# Altium footprint library BeaconBoard.PcbLib: 39 footprints (part 2 of 3)
Each footprint in its own frame and in the unit in brackets; x right, y up, seen from the top. Pads: shape width x height; smd on the part's side, far side on the other; paste and mask are expansions set on the pad; w line width, h text height; cw(c..) or ccw(c..) is an arc to the next point about the centre after c.
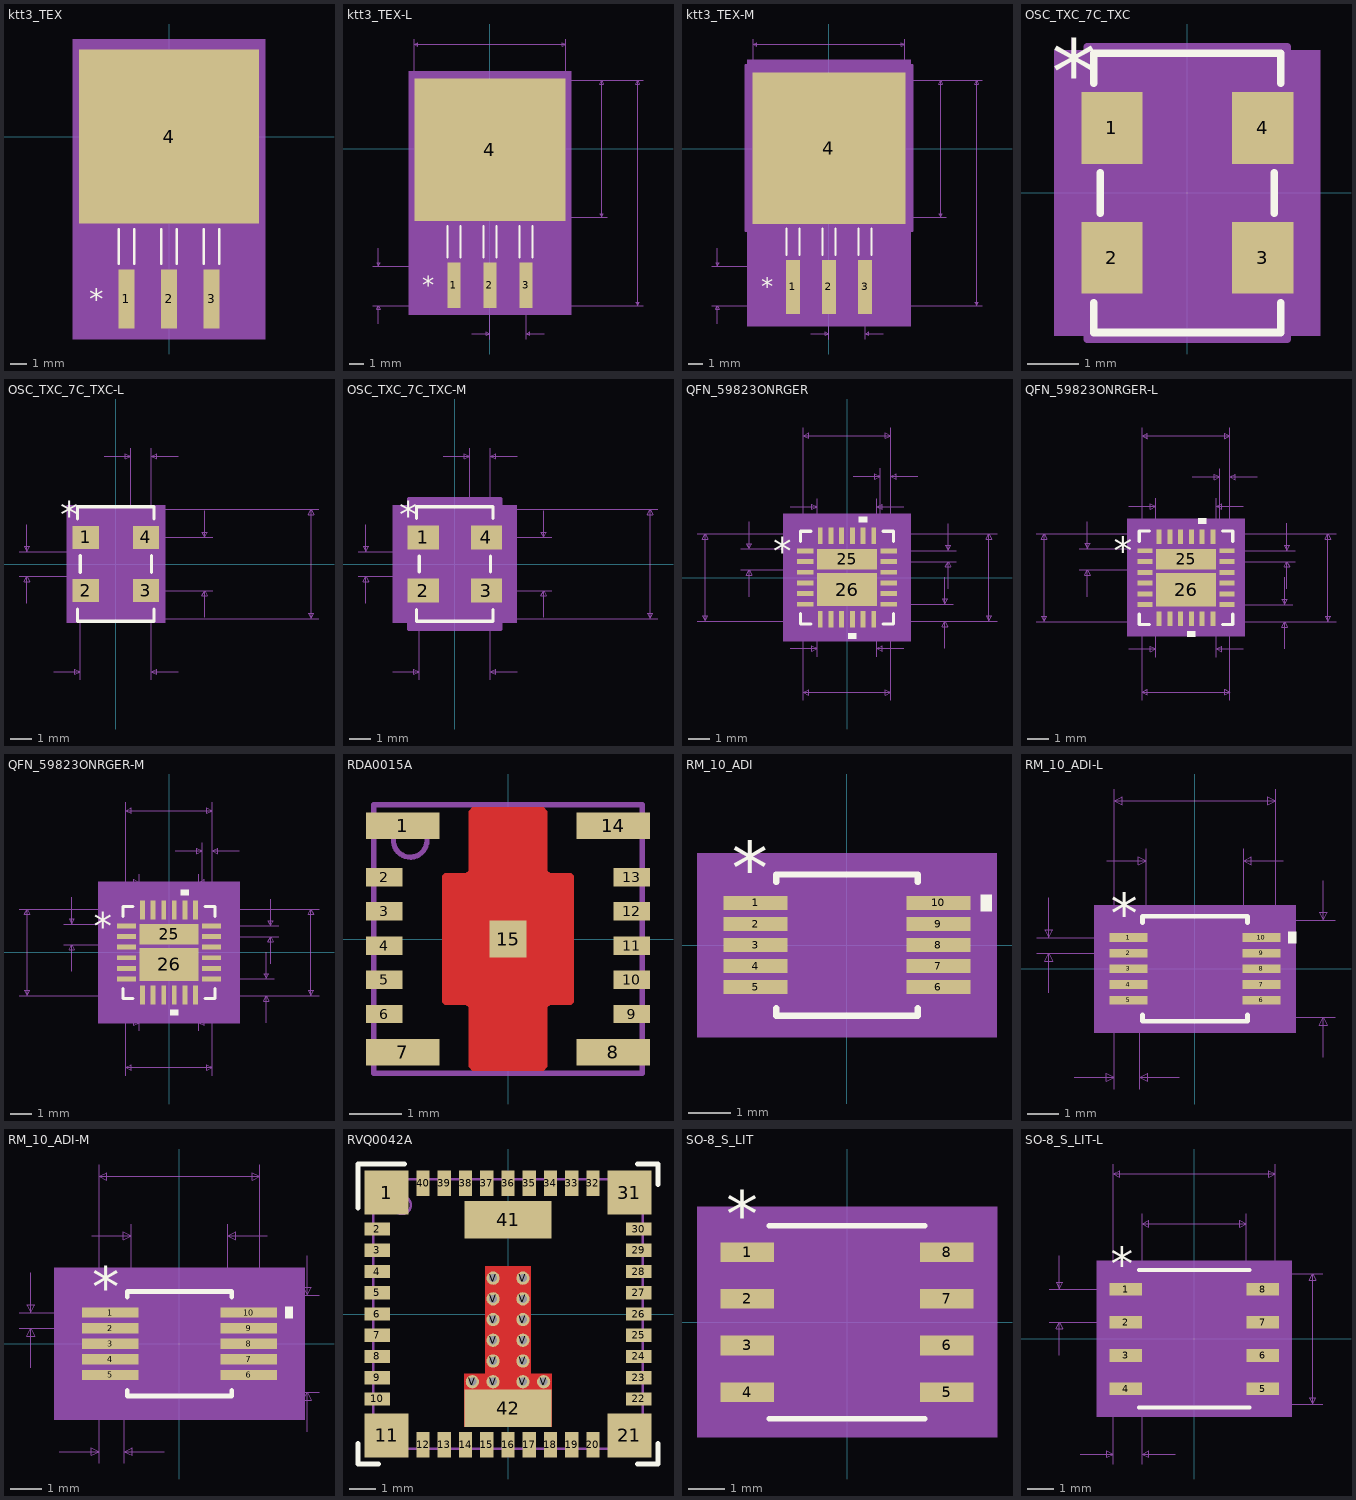
[diagram p1: the footprints below, top view; thin cyan lines are the x and y axes]

## ktt3_TEX [mil]
pads (4):
  rect 38x138 smd paste+0 mask+0: 1(-100,-381) 2(0,-381) 3(100,-381)
  rect 422x408 smd paste+0 mask+0: 4(0,0)
Top Overlay:
  lines w6: -118,-298 -118,-217.1 ; -82,-298 -82,-217.1 ; -18,-298 -18,-217.1 ; 18,-298 18,-217.1 ; 82,-298 82,-217.1 ; 118,-298 118,-217.1
  text "*" at -187.5,-406 h50
Mechanical 5:
  region: -226,229 226,229 226,-475 -226,-475
Mechanical 13:
  lines w1: -210,-190 -210,190 210,190 210,-190 -210,-190 ; -118,-436 -82,-436 -82,-190 -118,-190 -118,-436 ; -18,-436 18,-436 18,-190 -18,-190 -18,-436 ; 82,-436 118,-436 118,-190 82,-190 82,-436
  text "*" at -112.5,-205 h50
Mechanical 15:
  region: -129,-214 -221,-214 -221,214 221,214 221,-214 129,-214 129,-460 -129,-460
  lines w6: -221,-214 -129,-214 -129,-460 129,-460 129,-214 221,-214 221,214 -221,214 -221,-214
3D body: height 10, standoff 0, extent 0,0 10,10
3D body "ktt3_TEX.step": height 67.09, standoff -2.01, extent -210,-292.98 210,190.13

## ktt3_TEX-L [mil]
pads (4):
  rect 36x126 smd paste+0 mask+0: 1(-100,-379) 2(0,-379) 3(100,-379)
  rect 420x396 smd paste+0 mask+0: 4(0,-2)
Top Overlay:
  lines w6: -118,-302 -118,-214 ; -82,-302 -82,-214 ; -18,-302 -18,-214 ; 18,-302 18,-214 ; 82,-302 82,-214 ; 118,-302 118,-214
  text "*" at -187.5,-404 h50
Mechanical 5:
  region: -225,215 225,215 225,-461 -225,-461
Mechanical 7:
  lines w1: -325,-436 0,-436 425,-436 ; -325,-326 0,-326 ; -310,-486 -310,-436 ; -310,-276 -310,-326 ; -210,0 -210,305 ; -50,-513 0,-513 ; 0,-528 0,-313 ; 0,-190 325,-190 ; 100,-528 100,-313 ; 150,-513 100,-513 ; 210,0 210,305 ; 325,190 0,190 425,190 ; -310,-436 -305,-446 -315,-446 -310,-436 ; -310,-326 -305,-316 -315,-316 -310,-326 ; -210,290 -200,285 -200,295 -210,290 ; -210,290 210,290 ; 0,-513 -10,-518 -10,-508 0,-513 ; 100,-513 110,-518 110,-508 100,-513 ; 210,290 200,285 200,295 210,290 ; 310,-190 315,-180 305,-180 310,-190 ; 310,-190 310,190 ; 310,190 315,180 305,180 310,190 ; 410,-436 415,-426 405,-426 410,-436 ; 410,-436 410,190 ; 410,190 415,180 405,180 410,190
  text "0.1in/2.54mm" at -25,-558 h25
  text "0.11in/2.794mm" at -505,-393.5 h25
  text "0.626in/15.9mm" at 430,-201.5 h25
  text "0.42in/10.668mm" at -93.75,310 h25
  text "0.38in/9.652mm" at 330,-12.5 h25
  text "Alt 2 Padstyle: OX90Y60D30P" at -337.5,-1011 h50
  text "Alt 1 Padstyle: OX60Y90D30P" at -337.5,-936 h50
  text "Large Padstyle: RX420Y396D0T" at -350,-861 h50
  text "Default Padstyle: RX36Y126D0T" at -362.5,-786 h50
Mechanical 13:
  lines w1: -210,-190 -210,190 210,190 210,-190 -210,-190 ; -118,-436 -82,-436 -82,-190 -118,-190 -118,-436 ; -18,-436 18,-436 18,-190 -18,-190 -18,-436 ; 82,-436 118,-436 118,-190 82,-190 82,-436
  text "*" at -112.5,-205 h50
Mechanical 15:
  region: -122,-204 -214,-204 -214,200 214,200 214,-204 122,-204 122,-446 -122,-446
  lines w6: -214,-204 -122,-204 -122,-446 122,-446 122,-204 214,-204 214,200 -214,200 -214,-204
3D body: height 10, standoff 0, extent 0,0 10,10
3D body "ktt3_TEX.step": height 67.09, standoff -2.01, extent -210,-292.98 210,190.13

## ktt3_TEX-M [mil]
pads (4):
  rect 38x150 smd paste+0 mask+0: 1(-100,-383) 2(0,-383) 3(100,-383)
  rect 424x420 smd paste+0 mask+0: 4(0,2)
Top Overlay:
  lines w6: -118,-294 -118,-221.1 ; -82,-294 -82,-221.1 ; -18,-294 -18,-221.1 ; 18,-294 18,-221.1 ; 82,-294 82,-221.1 ; 118,-294 118,-221.1
  text "*" at -187.5,-408 h50
Mechanical 5:
  region: -227,247 227,247 227,-493 -227,-493
Mechanical 7:
  lines w1: -325,-436 0,-436 425,-436 ; -325,-326 0,-326 ; -310,-486 -310,-436 ; -310,-276 -310,-326 ; -210,0 -210,305 ; -50,-513 0,-513 ; 0,-528 0,-313 ; 0,-190 325,-190 ; 100,-528 100,-313 ; 150,-513 100,-513 ; 210,0 210,305 ; 325,190 0,190 425,190 ; -310,-436 -305,-446 -315,-446 -310,-436 ; -310,-326 -305,-316 -315,-316 -310,-326 ; -210,290 -200,285 -200,295 -210,290 ; -210,290 210,290 ; 0,-513 -10,-518 -10,-508 0,-513 ; 100,-513 110,-518 110,-508 100,-513 ; 210,290 200,285 200,295 210,290 ; 310,-190 315,-180 305,-180 310,-190 ; 310,-190 310,190 ; 310,190 315,180 305,180 310,190 ; 410,-436 415,-426 405,-426 410,-436 ; 410,-436 410,190 ; 410,190 415,180 405,180 410,190
  text "0.1in/2.54mm" at -25,-558 h25
  text "0.11in/2.794mm" at -505,-393.5 h25
  text "0.626in/15.9mm" at 430,-205.5 h25
  text "0.42in/10.668mm" at -93.75,310 h25
  text "0.38in/9.652mm" at 330,-12.5 h25
  text "Alt 2 Padstyle: OX90Y60D30P" at -337.5,-1011 h50
  text "Alt 1 Padstyle: OX60Y90D30P" at -337.5,-936 h50
  text "Large Padstyle: RX424Y420D0T" at -350,-861 h50
  text "Default Padstyle: RX38Y150D0T" at -362.5,-786 h50
Mechanical 13:
  lines w1: -210,-190 -210,190 210,190 210,-190 -210,-190 ; -118,-436 -82,-436 -82,-190 -118,-190 -118,-436 ; -18,-436 18,-436 18,-190 -18,-190 -18,-436 ; 82,-436 118,-436 118,-190 82,-190 82,-436
  text "*" at -112.5,-205 h50
Mechanical 15:
  region: -139,-228 -232,-228 -232,232 232,232 232,-228 139,-228 139,-478 -139,-478
  lines w6: -232,-228 -139,-228 -139,-478 139,-478 139,-228 232,-228 232,232 -232,232 -232,-228
3D body "ktt3_TEX.step": height 67.09, standoff -2.01, extent -209.99,-292.99 210.01,190.12
3D body: height 10, standoff 0, extent 0,0 10,10

## OSC_TXC_7C_TXC [mm]
pads (4):
  rect 1.2x1.4 smd paste+0 mask+0: 1(-1.473,1.27) 2(-1.473,-1.27) 3(1.473,-1.27) 4(1.473,1.27)
Top Overlay:
  lines w0.152: -1.829,-2.149 -1.829,-2.73 1.829,-2.73 1.829,-2.149 ; -1.829,2.149 -1.829,2.73 1.829,2.73 1.829,2.149 ; -1.702,-0.391 -1.702,0.391 ; 1.702,-0.391 1.702,0.391
  text "*" at -2.654,1.74 h1.27
Mechanical 5:
  region: 2.603,-2.794 -2.603,-2.794 -2.603,2.794 2.603,2.794
Mechanical 13:
  lines w0: -1.702,-1.765 ccw(c-1.702,-1.27) -1.702,-0.775 ; -1.702,0.775 ccw(c-1.702,1.27) -1.702,1.765 ; 1.702,-1.765 cw(c1.702,-1.27) 1.702,-0.775 ; 1.702,0.775 cw(c1.702,1.27) 1.702,1.765
  lines w0.025: -1.702,-1.765 -1.702,-2.603 1.702,-2.603 1.702,-1.765 ; -1.702,-0.775 -1.702,0.775 ; -1.702,1.765 -1.702,2.603 1.702,2.603 1.702,1.765 ; -1.702,2.349 -1.448,2.603 ; 1.702,-0.775 1.702,0.775
  text "*" at -1.384,1.105 h1.27
Mechanical 15:
  region: -1.956,-2.07 -2.413,-2.07 -2.413,2.07 -1.956,2.07 -1.956,2.857 1.956,2.857 1.956,2.07 2.413,2.07 2.413,-2.07 1.956,-2.07 1.956,-2.857 -1.956,-2.857
  lines w0.152: -2.413,-2.07 -2.413,2.07 -1.956,2.07 -1.956,2.857 1.956,2.857 1.956,2.07 2.413,2.07 2.413,-2.07 1.956,-2.07 1.956,-2.857 -1.956,-2.857 -1.956,-2.07 -2.413,-2.07
3D body: height 0.25, standoff 0, extent 0,0 0.254,0.254

## OSC_TXC_7C_TXC-L [mil]
pads (4):
  rect 49x43 smd paste+0 mask+0: 1(-56.5,50) 2(-56.5,-50) 3(56.5,-50) 4(56.5,50)
Top Overlay:
  lines w6: -72,-84.6 -72,-107.5 72,-107.5 72,-84.6 ; -72,84.6 -72,107.5 72,107.5 72,84.6 ; -67,-15.4 -67,15.4 ; 67,-15.4 67,15.4
  text "*" at -104.5,68.5 h50
Mechanical 5:
  region: 92.5,-110 -92.5,-110 -92.5,110 92.5,110
Mechanical 7:
  lines w1: -182,-23.5 -67,-23.5 ; -182,23.5 -67,23.5 ; -167,-73.5 -167,-23.5 ; -167,73.5 -167,23.5 ; -117,-202.5 -67,-202.5 ; -67,-217.5 -67,25 ; -22,202.5 28,202.5 ; 28,25 28,217.5 ; 67,-217.5 67,25 67,217.5 ; 67,-102.5 382,-102.5 ; 67,-50 182,-50 ; 67,50 182,50 ; 67,102.5 382,102.5 ; 117,-202.5 67,-202.5 ; 117,202.5 67,202.5 ; 167,-100 167,-50 ; 167,100 167,50 ; -167,-23.5 -162,-33.5 -172,-33.5 -167,-23.5 ; -167,23.5 -162,33.5 -172,33.5 -167,23.5 ; -67,-202.5 -77,-207.5 -77,-197.5 -67,-202.5 ; 28,202.5 18,197.5 18,207.5 28,202.5 ; 67,-202.5 77,-207.5 77,-197.5 67,-202.5 ; 67,202.5 77,197.5 77,207.5 67,202.5 ; 167,-50 172,-60 162,-60 167,-50 ; 167,50 172,60 162,60 167,50 ; 367,-102.5 372,-92.5 362,-92.5 367,-102.5 ; 367,-102.5 367,102.5 ; 367,102.5 372,92.5 362,92.5 367,102.5
  text "0.047in/1.194mm" at -374.5,-12.5 h25
  text "0.205in/5.207mm" at 387,-12.5 h25
  text "0.1in/2.54mm" at 187,-12.5 h25
  text "0.039in/0.991mm" at -46.25,222.5 h25
  text "0.134in/3.404mm" at -93.75,-247.5 h25
  text "Alt 2 Padstyle: OX90Y60D30P" at -337.5,-472.5 h50
  text "Alt 1 Padstyle: OX60Y90D30P" at -337.5,-412.5 h50
  text "Default Padstyle: RX49Y43D0T" at -350,-352.5 h50
Mechanical 13:
  lines w0: -67,-69.5 ccw(c-67,-50) -67,-30.5 ; -67,30.5 ccw(c-67,50) -67,69.5 ; 67,-69.5 cw(c67,-50) 67,-30.5 ; 67,30.5 cw(c67,50) 67,69.5
  lines w1: -67,-69.5 -67,-102.5 67,-102.5 67,-69.5 ; -67,-30.5 -67,30.5 ; -67,69.5 -67,102.5 67,102.5 67,69.5 ; -67,92.5 -57,102.5 ; 67,-30.5 67,30.5
  text "*" at -54.5,43.5 h50
Mechanical 15:
  region: -71,-75.5 -85,-75.5 -85,75.5 -71,75.5 -71,106.5 71,106.5 71,75.5 85,75.5 85,-75.5 71,-75.5 71,-106.5 -71,-106.5
  lines w6: -85,-75.5 -71,-75.5 -71,-106.5 71,-106.5 71,-75.5 85,-75.5 85,75.5 71,75.5 71,106.5 -71,106.5 -71,75.5 -85,75.5 -85,-75.5
3D body: height 10, standoff 0, extent 0,0 10,10

## OSC_TXC_7C_TXC-M [mil]
pads (4):
  rect 59x45 smd paste+0 mask+0: 1(-59.5,50) 2(-59.5,-50) 3(59.5,-50) 4(59.5,50)
Top Overlay:
  lines w6: -72,-85.6 -72,-107.5 72,-107.5 72,-85.6 ; -72,85.6 -72,107.5 72,107.5 72,85.6 ; -67,-14.4 -67,14.4 ; 67,-14.4 67,14.4
  text "*" at -104.5,68.5 h50
Mechanical 5:
  region: 116.5,-110 -116.5,-110 -116.5,110 116.5,110
Mechanical 7:
  lines w1: -182,-23.5 -67,-23.5 ; -182,23.5 -67,23.5 ; -167,-73.5 -167,-23.5 ; -167,73.5 -167,23.5 ; -117,-202.5 -67,-202.5 ; -67,-217.5 -67,25 ; -22,202.5 28,202.5 ; 28,25 28,217.5 ; 67,-217.5 67,25 67,217.5 ; 67,-102.5 382,-102.5 ; 67,-50 182,-50 ; 67,50 182,50 ; 67,102.5 382,102.5 ; 117,-202.5 67,-202.5 ; 117,202.5 67,202.5 ; 167,-100 167,-50 ; 167,100 167,50 ; -167,-23.5 -172,-33.5 -162,-33.5 -167,-23.5 ; -167,23.5 -172,33.5 -162,33.5 -167,23.5 ; -67,-202.5 -77,-197.5 -77,-207.5 -67,-202.5 ; 28,202.5 18,207.5 18,197.5 28,202.5 ; 67,-202.5 77,-197.5 77,-207.5 67,-202.5 ; 67,202.5 77,207.5 77,197.5 67,202.5 ; 167,-50 162,-60 172,-60 167,-50 ; 167,50 162,60 172,60 167,50 ; 367,-102.5 367,102.5 ; 367,-102.5 362,-92.5 372,-92.5 367,-102.5 ; 367,102.5 362,92.5 372,92.5 367,102.5
  text "Default Padstyle: RX59Y45D0T" at -350,-352.5 h50
  text "Alt 1 Padstyle: OX60Y90D30P" at -337.5,-412.5 h50
  text "Alt 2 Padstyle: OX90Y60D30P" at -337.5,-472.5 h50
  text "0.134in/3.404mm" at -93.75,-247.5 h25
  text "0.039in/0.991mm" at -46.25,222.5 h25
  text "0.1in/2.54mm" at 187,-12.5 h25
  text "0.205in/5.207mm" at 387,-12.5 h25
  text "0.047in/1.194mm" at -374.5,-12.5 h25
Mechanical 13:
  lines w0: -67,-69.5 ccw(c-67,-50) -67,-30.5 ; -67,30.5 ccw(c-67,50) -67,69.5 ; 67,-69.5 cw(c67,-50) 67,-30.5 ; 67,30.5 cw(c67,50) 67,69.5
  lines w1: -67,-69.5 -67,-102.5 67,-102.5 67,-69.5 ; -67,-30.5 -67,30.5 ; -67,69.5 -67,102.5 67,102.5 67,69.5 ; -67,92.5 -57,102.5 ; 67,-30.5 67,30.5
  text "*" at -54.5,43.5 h50
Mechanical 15:
  region: -87,-92.5 -109,-92.5 -109,92.5 -87,92.5 -87,122.5 87,122.5 87,92.5 109,92.5 109,-92.5 87,-92.5 87,-122.5 -87,-122.5
  lines w6: -109,-92.5 -109,92.5 -87,92.5 -87,122.5 87,122.5 87,92.5 109,92.5 109,-92.5 87,-92.5 87,-122.5 -87,-122.5 -87,-92.5 -109,-92.5
3D body: height 10, standoff 0, extent 0,0 10,10

## QFN_59823ONRGER [mm]
pads (26):
  rect 0.783x0.229 smd paste+0 mask+0: 1(-1.953,1.25) 2(-1.953,0.75) 3(-1.953,0.25) 4(-1.953,-0.25) 5(-1.953,-0.75) 6(-1.953,-1.25) 13(1.953,-1.25) 14(1.953,-0.75) 15(1.953,-0.25) 16(1.953,0.25) 17(1.953,0.75) 18(1.953,1.25)
  rect 0.229x0.783 smd paste+0 mask+0: 7(-1.25,-1.953) 8(-0.75,-1.953) 9(-0.25,-1.953) 10(0.25,-1.953) 11(0.75,-1.953) 12(1.25,-1.953) 19(1.25,1.953) 20(0.75,1.953) 21(0.25,1.953) 22(-0.25,1.953) 23(-0.75,1.953) 24(-1.25,1.953)
  rect 2.794x0.965 smd paste+0 mask+0: 25(0,0.856)
  rect 2.794x1.549 smd paste+0 mask+0: 26(0,-0.564)
Top Overlay:
  region: 0.941,2.599 0.56,2.599 0.56,2.853 0.941,2.853
  region: 0.44,-2.599 0.059,-2.599 0.059,-2.853 0.44,-2.853
  lines w0.152: -2.172,-1.697 -2.172,-2.172 -1.697,-2.172 ; -2.172,1.697 -2.172,2.172 -1.697,2.172 ; 1.697,-2.172 2.172,-2.172 2.172,-1.697 ; 1.697,2.172 2.172,2.172 2.172,1.697
  text "*" at -3.45,0.615 h1.27
Mechanical 5:
  region: 2.98,-2.98 -2.98,-2.98 -2.98,2.98 2.98,2.98
Mechanical 7:
  lines w0.025: -7.021,-2.045 2.045,-2.045 ; -7.021,2.045 2.045,2.045 2.045,-5.751 ; -4.966,0.374 -1.397,0.374 -1.397,-3.696 ; -4.966,1.339 -1.397,1.339 -1.397,3.696 ; -4.585,-0.896 -4.585,0.374 ; -4.585,2.609 -4.585,1.339 ; -2.667,-3.315 -1.397,-3.315 ; -2.667,3.315 -1.397,3.315 ; -2.045,-5.751 -2.045,2.045 ; -2.045,1.25 -2.045,7.021 ; 0.292,4.735 1.562,4.735 ; 1.25,2.045 7.021,2.045 ; 1.397,-3.696 1.397,0.374 ; 1.397,1.339 1.397,3.696 ; 1.562,1.25 1.562,5.116 ; 1.953,0.75 5.116,0.75 ; 1.953,1.25 5.116,1.25 ; 2.045,-1.25 4.966,-1.25 ; 2.045,5.116 2.045,1.25 2.045,7.021 ; 2.667,-3.315 1.397,-3.315 ; 2.667,3.315 1.397,3.315 ; 3.315,4.735 2.045,4.735 ; 4.585,-3.315 4.585,-2.045 ; 4.585,0.02 4.585,-1.25 ; 4.735,-0.52 4.735,0.75 ; 4.735,2.52 4.735,1.25 ; 4.966,-2.045 1.25,-2.045 7.021,-2.045 ; -6.64,-2.045 -6.513,-1.791 -6.767,-1.791 -6.64,-2.045 ; -6.64,-2.045 -6.64,2.045 ; -6.64,2.045 -6.513,1.791 -6.767,1.791 -6.64,2.045 ; -4.585,0.374 -4.458,0.12 -4.712,0.12 -4.585,0.374 ; -4.585,1.339 -4.458,1.593 -4.712,1.593 -4.585,1.339 ; -2.045,-5.37 -1.791,-5.497 -1.791,-5.243 -2.045,-5.37 ; -2.045,-5.37 2.045,-5.37 ; -2.045,6.64 -1.791,6.513 -1.791,6.767 -2.045,6.64 ; -2.045,6.64 2.045,6.64 ; -1.397,-3.315 -1.651,-3.442 -1.651,-3.188 -1.397,-3.315 ; -1.397,3.315 -1.651,3.188 -1.651,3.442 -1.397,3.315 ; 1.397,-3.315 1.651,-3.442 1.651,-3.188 1.397,-3.315 ; 1.397,3.315 1.651,3.188 1.651,3.442 1.397,3.315 ; 1.562,4.735 1.308,4.608 1.308,4.862 1.562,4.735 ; 2.045,-5.37 1.791,-5.497 1.791,-5.243 2.045,-5.37 ; 2.045,4.735 2.299,4.608 2.299,4.862 2.045,4.735 ; 2.045,6.64 1.791,6.513 1.791,6.767 2.045,6.64 ; 4.585,-2.045 4.712,-2.299 4.458,-2.299 4.585,-2.045 ; 4.585,-1.25 4.712,-0.996 4.458,-0.996 4.585,-1.25 ; 4.735,0.75 4.862,0.496 4.608,0.496 4.735,0.75 ; 4.735,1.25 4.862,1.504 4.608,1.504 4.735,1.25 ; 6.64,-2.045 6.767,-1.791 6.513,-1.791 6.64,-2.045 ; 6.64,-2.045 6.64,2.045 ; 6.64,2.045 6.767,1.791 6.513,1.791 6.64,2.045
  text "0.031in/0.795mm" at 2.203,-1.903 h0.64
  text "-0.11in/-2.794mm" at -2.54,3.823 h0.64
  text "0.038in/0.965mm" at -6.966,-0.508 h0.64
  text "0.11in/2.794mm" at -2.222,-4.458 h0.64
  text "0.161in/4.089mm" at -2.381,-6.513 h0.64
  text "0.161in/4.089mm" at -11.91,-0.318 h0.64
  text "0.161in/4.089mm" at 7.148,-0.318 h0.64
  text "0.161in/4.089mm" at -2.381,7.148 h0.64
  text "0.019in/0.483mm" at -0.578,5.243 h0.64
  text "0.02in/0.5mm" at 2.83,0.683 h0.64
  text "Alt 2 Padstyle: b229_152h76" at -8.572,-20.737 h1.27
  text "Alt 1 Padstyle: b152_229h76" at -8.572,-19.213 h1.27
  text "Heat Tab 2 Padstyle: r279_155" at -9.207,-11.593 h1.27
  text "Heat Tab 1 Padstyle: r279_97" at -8.89,-10.069 h1.27
  text "Default Padstyle: r23_78" at -7.62,-8.545 h1.27
Mechanical 13:
  lines w0.025: -2.045,0.775 -0.775,2.045 ; -2.045,-2.045 -2.045,2.045 2.045,2.045 2.045,-2.045 -2.045,-2.045 ; -2.045,-1.39 -2.045,-1.11 -2.045,-1.39 ; -2.045,-0.89 -2.045,-0.61 -2.045,-0.89 ; -2.045,-0.39 -2.045,-0.11 -2.045,-0.39 ; -2.045,0.11 -2.045,0.39 -2.045,0.11 ; -2.045,0.61 -2.045,0.89 -2.045,0.61 ; -2.045,1.11 -2.045,1.39 -2.045,1.11 ; -1.39,-2.045 -1.11,-2.045 -1.39,-2.045 ; -1.39,2.045 -1.11,2.045 -1.39,2.045 ; -0.89,-2.045 -0.61,-2.045 -0.89,-2.045 ; -0.89,2.045 -0.61,2.045 -0.89,2.045 ; -0.39,-2.045 -0.11,-2.045 -0.39,-2.045 ; -0.39,2.045 -0.11,2.045 -0.39,2.045 ; 0.11,-2.045 0.39,-2.045 0.11,-2.045 ; 0.11,2.045 0.39,2.045 0.11,2.045 ; 0.61,-2.045 0.89,-2.045 0.61,-2.045 ; 0.61,2.045 0.89,2.045 0.61,2.045 ; 1.11,-2.045 1.39,-2.045 1.11,-2.045 ; 1.11,2.045 1.39,2.045 1.11,2.045 ; 2.045,-1.39 2.045,-1.11 2.045,-1.39 ; 2.045,-0.89 2.045,-0.61 2.045,-0.89 ; 2.045,-0.39 2.045,-0.11 2.045,-0.39 ; 2.045,0.11 2.045,0.39 2.045,0.11 ; 2.045,0.61 2.045,0.89 2.045,0.61 ; 2.045,1.11 2.045,1.39 2.045,1.11
  text "*" at -1.092,0.615 h1.27
Mechanical 15:
  region: -1.619,-2.299 -2.299,-2.299 -2.299,-1.619 -2.599,-1.619 -2.599,1.619 -2.299,1.619 -2.299,2.299 -1.619,2.299 -1.619,2.599 1.619,2.599 1.619,2.299 2.299,2.299 2.299,1.619 2.599,1.619 2.599,-1.619 2.299,-1.619 2.299,-2.299 1.619,-2.299 1.619,-2.599 -1.619,-2.599
  lines w0.152: -2.599,-1.619 -2.599,1.619 -2.299,1.619 -2.299,2.299 -1.619,2.299 -1.619,2.599 1.619,2.599 1.619,2.299 2.299,2.299 2.299,1.619 2.599,1.619 2.599,-1.619 2.299,-1.619 2.299,-2.299 1.619,-2.299 1.619,-2.599 -1.619,-2.599 -1.619,-2.299 -2.299,-2.299 -2.299,-1.619 -2.599,-1.619
3D body "QFN_59823ONRGER.step": height 0.99, standoff 0, extent -2.045,-2.045 2.045,2.045
3D body: height 0.25, standoff 0, extent 0,0 0.254,0.254

## QFN_59823ONRGER-L [mm]
pads (26):
  rect 0.683x0.229 smd paste+0 mask+0: 1(-3811.903,-3808.75) 2(-3811.903,-3809.25) 3(-3811.903,-3809.75) 4(-3811.903,-3810.25) 5(-3811.903,-3810.75) 6(-3811.903,-3811.25) 13(-3808.097,-3811.25) 14(-3808.097,-3810.75) 15(-3808.097,-3810.25) 16(-3808.097,-3809.75) 17(-3808.097,-3809.25) 18(-3808.097,-3808.75)
  rect 0.229x0.683 smd paste+0 mask+0: 7(-3811.25,-3811.903) 8(-3810.75,-3811.903) 9(-3810.25,-3811.903) 10(-3809.75,-3811.903) 11(-3809.25,-3811.903) 12(-3808.75,-3811.903) 19(-3808.75,-3808.097) 20(-3809.25,-3808.097) 21(-3809.75,-3808.097) 22(-3810.25,-3808.097) 23(-3810.75,-3808.097) 24(-3811.25,-3808.097)
  rect 2.794x0.965 smd paste+0 mask+0: 25(-3810,-3809.144)
  rect 2.794x1.549 smd paste+0 mask+0: 26(-3810,-3810.564)
Top Overlay:
  region: -3809.059,-3807.501 -3809.44,-3807.501 -3809.44,-3807.247 -3809.059,-3807.247
  region: -3809.56,-3812.499 -3809.941,-3812.499 -3809.941,-3812.753 -3809.56,-3812.753
  lines w0.152: -3812.172,-3811.697 -3812.172,-3812.172 -3811.697,-3812.172 ; -3812.172,-3808.303 -3812.172,-3807.828 -3811.697,-3807.828 ; -3808.303,-3812.172 -3807.828,-3812.172 -3807.828,-3811.697 ; -3808.303,-3807.828 -3807.828,-3807.828 -3807.828,-3808.303
  text "*" at -3813.35,-3809.385 h1.27
Mechanical 5:
  region: -3807.273,-3812.727 -3812.727,-3812.727 -3812.727,-3807.273 -3807.273,-3807.273
Mechanical 7:
  lines w0.025: -3816.971,-3812.045 -3807.955,-3812.045 ; -3816.971,-3807.955 -3807.955,-3807.955 -3807.955,-3815.701 ; -3814.966,-3809.626 -3811.397,-3809.626 -3811.397,-3813.696 ; -3814.966,-3808.661 -3811.397,-3808.661 -3811.397,-3806.304 ; -3814.585,-3810.896 -3814.585,-3809.626 ; -3814.585,-3807.391 -3814.585,-3808.661 ; -3812.667,-3813.315 -3811.397,-3813.315 ; -3812.667,-3806.685 -3811.397,-3806.685 ; -3812.045,-3815.701 -3812.045,-3807.955 ; -3812.045,-3808.75 -3812.045,-3803.029 ; -3809.708,-3805.315 -3808.438,-3805.315 ; -3808.75,-3807.955 -3803.029,-3807.955 ; -3808.603,-3813.696 -3808.603,-3809.626 ; -3808.603,-3808.661 -3808.603,-3806.304 ; -3808.438,-3808.75 -3808.438,-3804.934 ; -3808.097,-3809.25 -3804.934,-3809.25 ; -3808.097,-3808.75 -3804.934,-3808.75 ; -3807.955,-3811.25 -3805.034,-3811.25 ; -3807.955,-3804.934 -3807.955,-3808.75 -3807.955,-3803.029 ; -3807.333,-3813.315 -3808.603,-3813.315 ; -3807.333,-3806.685 -3808.603,-3806.685 ; -3806.685,-3805.315 -3807.955,-3805.315 ; -3805.415,-3813.315 -3805.415,-3812.045 ; -3805.415,-3809.98 -3805.415,-3811.25 ; -3805.315,-3810.52 -3805.315,-3809.25 ; -3805.315,-3807.48 -3805.315,-3808.75 ; -3805.034,-3812.045 -3808.75,-3812.045 -3803.029,-3812.045 ; -3816.59,-3812.045 -3816.463,-3811.791 -3816.717,-3811.791 -3816.59,-3812.045 ; -3816.59,-3812.045 -3816.59,-3807.955 ; -3816.59,-3807.955 -3816.463,-3808.209 -3816.717,-3808.209 -3816.59,-3807.955 ; -3814.585,-3809.626 -3814.458,-3809.88 -3814.712,-3809.88 -3814.585,-3809.626 ; -3814.585,-3808.661 -3814.458,-3808.407 -3814.712,-3808.407 -3814.585,-3808.661 ; -3812.045,-3815.32 -3811.791,-3815.447 -3811.791,-3815.193 -3812.045,-3815.32 ; -3812.045,-3815.32 -3807.955,-3815.32 ; -3812.045,-3803.41 -3811.791,-3803.537 -3811.791,-3803.283 -3812.045,-3803.41 ; -3812.045,-3803.41 -3807.955,-3803.41 ; -3811.397,-3813.315 -3811.651,-3813.442 -3811.651,-3813.188 -3811.397,-3813.315 ; -3811.397,-3806.685 -3811.651,-3806.812 -3811.651,-3806.558 -3811.397,-3806.685 ; -3808.603,-3813.315 -3808.349,-3813.442 -3808.349,-3813.188 -3808.603,-3813.315 ; -3808.603,-3806.685 -3808.349,-3806.812 -3808.349,-3806.558 -3808.603,-3806.685 ; -3808.438,-3805.315 -3808.692,-3805.442 -3808.692,-3805.188 -3808.438,-3805.315 ; -3807.955,-3815.32 -3808.209,-3815.447 -3808.209,-3815.193 -3807.955,-3815.32 ; -3807.955,-3805.315 -3807.701,-3805.442 -3807.701,-3805.188 -3807.955,-3805.315 ; -3807.955,-3803.41 -3808.209,-3803.537 -3808.209,-3803.283 -3807.955,-3803.41 ; -3805.415,-3812.045 -3805.288,-3812.299 -3805.542,-3812.299 -3805.415,-3812.045 ; -3805.415,-3811.25 -3805.288,-3810.996 -3805.542,-3810.996 -3805.415,-3811.25 ; -3805.315,-3809.25 -3805.188,-3809.504 -3805.442,-3809.504 -3805.315,-3809.25 ; -3805.315,-3808.75 -3805.188,-3808.496 -3805.442,-3808.496 -3805.315,-3808.75 ; -3803.41,-3812.045 -3803.283,-3811.791 -3803.537,-3811.791 -3803.41,-3812.045 ; -3803.41,-3812.045 -3803.41,-3807.955 ; -3803.41,-3807.955 -3803.283,-3808.209 -3803.537,-3808.209 -3803.41,-3807.955
  text "0.031in/0.795mm" at -3807.797,-3811.853 h0.64
  text "-0.11in/-2.794mm" at -3812.54,-3806.177 h0.64
  text "0.038in/0.965mm" at -3816.966,-3810.508 h0.64
  text "0.11in/2.794mm" at -3812.222,-3814.458 h0.64
  text "0.161in/4.089mm" at -3812.381,-3816.463 h0.64
  text "0.161in/4.089mm" at -3821.86,-3810.317 h0.64
  text "0.161in/4.089mm" at -3802.902,-3810.317 h0.64
  text "0.161in/4.089mm" at -3812.381,-3802.902 h0.64
  text "0.019in/0.483mm" at -3810.578,-3804.807 h0.64
  text "0.02in/0.5mm" at -3807.22,-3809.317 h0.64
  text "Alt 2 Padstyle: b229_152h76" at -3818.572,-3830.687 h1.27
  text "Alt 1 Padstyle: b152_229h76" at -3818.572,-3829.163 h1.27
  text "Heat Tab 2 Padstyle: r279_155" at -3819.207,-3821.543 h1.27
  text "Heat Tab 1 Padstyle: r279_97" at -3818.89,-3820.019 h1.27
  text "Default Padstyle: r23_68" at -3817.62,-3818.495 h1.27